# Altium footprint library Package_DFN_QFN.PcbLib: 557 footprints (part 12 of 35)
Each footprint in its own frame and in the unit in brackets; x right, y up, seen from the top. Pads: shape width x height; smd on the part's side, far side on the other; paste and mask are expansions set on the pad; w line width, h text height; cw(c..) or ccw(c..) is an arc to the next point about the centre after c.
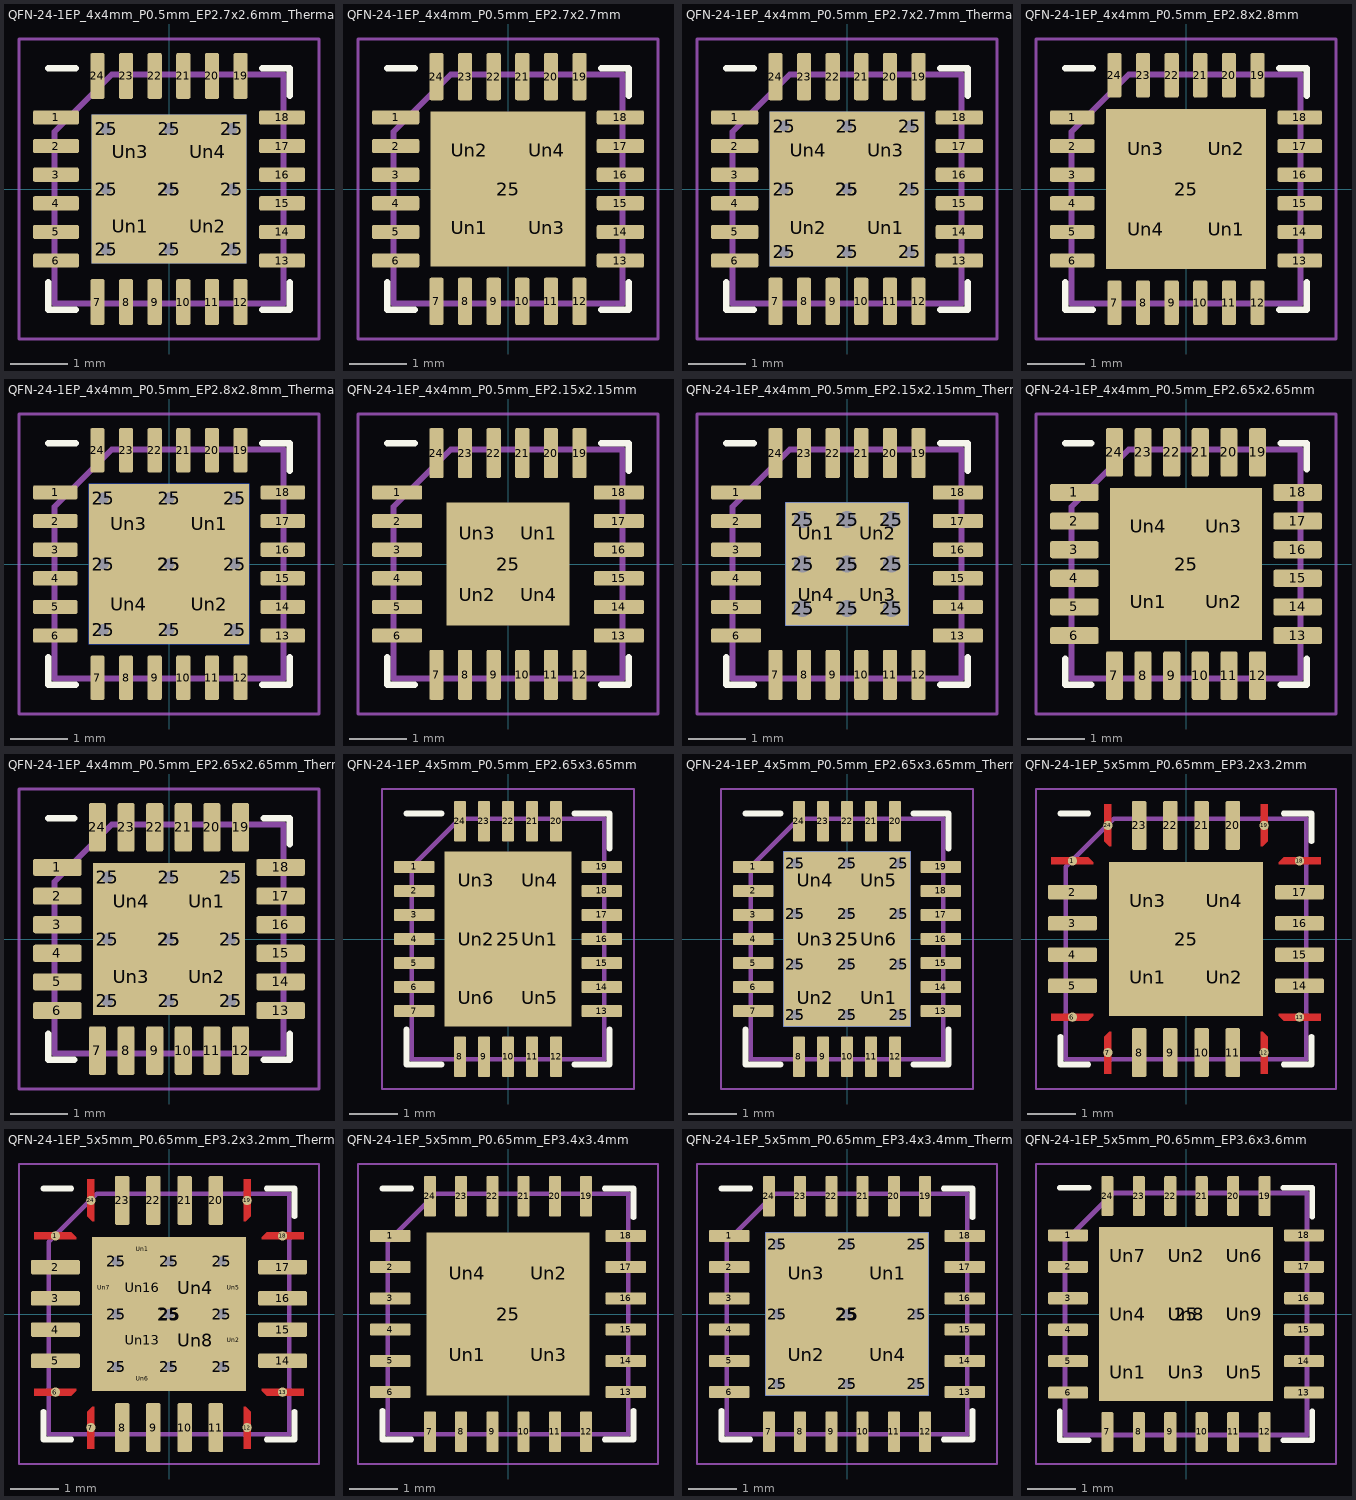
[diagram p11: the footprints below, top view; thin cyan lines are the x and y axes]

## QFN-24-1EP_4x4mm_P0.5mm_EP2.7x2.6mm_ThermalVias [mm]
pads (39):
  rrect25% 0.8x0.25 smd: 1(-1.975,1.25) 2(-1.975,0.75) 3(-1.975,0.25) 4(-1.975,-0.25) 5(-1.975,-0.75) 6(-1.975,-1.25) 13(1.975,-1.25) 14(1.975,-0.75) 15(1.975,-0.25) 16(1.975,0.25) 17(1.975,0.75) 18(1.975,1.25)
  rrect25% 0.25x0.8 smd: 7(-1.25,-1.975) 8(-0.75,-1.975) 9(-0.25,-1.975) 10(0.25,-1.975) 11(0.75,-1.975) 12(1.25,-1.975) 19(1.25,1.975) 20(0.75,1.975) 21(0.25,1.975) 22(-0.25,1.975) 23(-0.75,1.975) 24(-1.25,1.975)
  round 0.5 hole 0.2: 25(-1.1,-1.05) 25(-1.1,0) 25(-1.1,1.05) 25(0,-1.05) 25(0,0) 25(0,1.05) 25(1.1,-1.05) 25(1.1,0) 25(1.1,1.05)
  rect 2.7x2.6 smd: 25(0,0)
  rect 2.7x2.6 smd far side: 25(0,0)
  rrect22% 1.17x1.13 on Top Paste: Un1(-0.675,-0.65) Un2(0.675,-0.65) Un3(-0.675,0.65) Un4(0.675,0.65)
F.SilkS:
  lines w0.12: -2.11,-1.635 -2.11,-2.11 -1.635,-2.11 ; -2.11,2.11 -1.635,2.11 ; 1.635,-2.11 2.11,-2.11 2.11,-1.635 ; 1.635,2.11 2.11,2.11 2.11,1.635
F.CrtYd:
  lines w0.05: -2.62,-2.62 -2.62,2.62 2.62,2.62 2.62,-2.62 -2.62,-2.62
F.Fab:
  lines w0.1: -2,-2 -2,1 -1,2 2,2 2,-2 -2,-2
  text "'.Designator'" at -4.047,-0.84 h1

## QFN-24-1EP_4x4mm_P0.5mm_EP2.7x2.7mm [mm]
pads (29):
  rrect25% 0.825x0.25 smd: 1(-1.963,1.25) 2(-1.963,0.75) 3(-1.963,0.25) 4(-1.963,-0.25) 5(-1.963,-0.75) 6(-1.963,-1.25) 13(1.963,-1.25) 14(1.963,-0.75) 15(1.963,-0.25) 16(1.963,0.25) 17(1.963,0.75) 18(1.963,1.25)
  rrect25% 0.25x0.825 smd: 7(-1.25,-1.963) 8(-0.75,-1.963) 9(-0.25,-1.963) 10(0.25,-1.963) 11(0.75,-1.963) 12(1.25,-1.963) 19(1.25,1.963) 20(0.75,1.963) 21(0.25,1.963) 22(-0.25,1.963) 23(-0.75,1.963) 24(-1.25,1.963)
  rect 2.7x2.7 smd: 25(0,0)
  rrect23% 1.09x1.09 on Top Paste: Un1(-0.675,-0.675) Un2(-0.675,0.675) Un3(0.675,-0.675) Un4(0.675,0.675)
F.SilkS:
  lines w0.12: -2.11,-1.635 -2.11,-2.11 -1.635,-2.11 ; -2.11,2.11 -1.635,2.11 ; 1.635,-2.11 2.11,-2.11 2.11,-1.635 ; 1.635,2.11 2.11,2.11 2.11,1.635
F.CrtYd:
  lines w0.05: -2.62,-2.62 2.62,-2.62 2.62,2.62 -2.62,2.62 -2.62,-2.62
F.Fab:
  lines w0.1: -2,-2 2,-2 2,2 -1,2 -2,1 -2,-2
  text "'.Designator'" at -4.047,-0.84 h1

## QFN-24-1EP_4x4mm_P0.5mm_EP2.7x2.7mm_ThermalVias [mm]
pads (39):
  rrect25% 0.825x0.25 smd: 1(-1.963,1.25) 2(-1.963,0.75) 3(-1.963,0.25) 4(-1.963,-0.25) 5(-1.963,-0.75) 6(-1.963,-1.25) 13(1.963,-1.25) 14(1.963,-0.75) 15(1.963,-0.25) 16(1.963,0.25) 17(1.963,0.75) 18(1.963,1.25)
  rrect25% 0.25x0.825 smd: 7(-1.25,-1.963) 8(-0.75,-1.963) 9(-0.25,-1.963) 10(0.25,-1.963) 11(0.75,-1.963) 12(1.25,-1.963) 19(1.25,1.963) 20(0.75,1.963) 21(0.25,1.963) 22(-0.25,1.963) 23(-0.75,1.963) 24(-1.25,1.963)
  round 0.5 hole 0.2: 25(-1.1,-1.1) 25(-1.1,0) 25(-1.1,1.1) 25(0,-1.1) 25(0,0) 25(0,1.1) 25(1.1,-1.1) 25(1.1,0) 25(1.1,1.1)
  rect 2.7x2.7 smd far side: 25(0,0)
  rect 2.7x2.7 smd: 25(0,0)
  rrect21% 1.17x1.17 on Top Paste: Un1(0.675,-0.675) Un2(-0.675,-0.675) Un3(0.675,0.675) Un4(-0.675,0.675)
F.SilkS:
  lines w0.12: -2.11,-1.635 -2.11,-2.11 -1.635,-2.11 ; -2.11,2.11 -1.635,2.11 ; 1.635,-2.11 2.11,-2.11 2.11,-1.635 ; 1.635,2.11 2.11,2.11 2.11,1.635
F.CrtYd:
  lines w0.05: -2.62,-2.62 2.62,-2.62 2.62,2.62 -2.62,2.62 -2.62,-2.62
F.Fab:
  lines w0.1: -2,-2 -2,1 -1,2 2,2 2,-2 -2,-2
  text "'.Designator'" at -4.047,-0.84 h1

## QFN-24-1EP_4x4mm_P0.5mm_EP2.8x2.8mm [mm]
pads (29):
  rrect25% 0.775x0.25 smd: 1(-1.987,1.25) 2(-1.987,0.75) 3(-1.987,0.25) 4(-1.987,-0.25) 5(-1.987,-0.75) 6(-1.987,-1.25) 13(1.987,-1.25) 14(1.987,-0.75) 15(1.987,-0.25) 16(1.987,0.25) 17(1.987,0.75) 18(1.987,1.25)
  rrect25% 0.25x0.775 smd: 7(-1.25,-1.987) 8(-0.75,-1.987) 9(-0.25,-1.987) 10(0.25,-1.987) 11(0.75,-1.987) 12(1.25,-1.987) 19(1.25,1.987) 20(0.75,1.987) 21(0.25,1.987) 22(-0.25,1.987) 23(-0.75,1.987) 24(-1.25,1.987)
  rect 2.8x2.8 smd: 25(0,0)
  rrect22% 1.13x1.13 on Top Paste: Un1(0.7,-0.7) Un2(0.7,0.7) Un3(-0.7,0.7) Un4(-0.7,-0.7)
F.SilkS:
  lines w0.12: -2.11,-1.635 -2.11,-2.11 -1.635,-2.11 ; -2.11,2.11 -1.635,2.11 ; 1.635,-2.11 2.11,-2.11 2.11,-1.635 ; 1.635,2.11 2.11,2.11 2.11,1.635
F.CrtYd:
  lines w0.05: -2.62,-2.62 -2.62,2.62 2.62,2.62 2.62,-2.62 -2.62,-2.62
F.Fab:
  lines w0.1: -2,-2 2,-2 2,2 -1,2 -2,1 -2,-2
  text "'.Designator'" at -4.047,-0.84 h1

## QFN-24-1EP_4x4mm_P0.5mm_EP2.8x2.8mm_ThermalVias [mm]
pads (39):
  rrect25% 0.775x0.25 smd: 1(-1.987,1.25) 2(-1.987,0.75) 3(-1.987,0.25) 4(-1.987,-0.25) 5(-1.987,-0.75) 6(-1.987,-1.25) 13(1.987,-1.25) 14(1.987,-0.75) 15(1.987,-0.25) 16(1.987,0.25) 17(1.987,0.75) 18(1.987,1.25)
  rrect25% 0.25x0.775 smd: 7(-1.25,-1.987) 8(-0.75,-1.987) 9(-0.25,-1.987) 10(0.25,-1.987) 11(0.75,-1.987) 12(1.25,-1.987) 19(1.25,1.987) 20(0.75,1.987) 21(0.25,1.987) 22(-0.25,1.987) 23(-0.75,1.987) 24(-1.25,1.987)
  round 0.5 hole 0.2: 25(-1.15,-1.15) 25(-1.15,0) 25(-1.15,1.15) 25(0,-1.15) 25(0,0) 25(0,1.15) 25(1.15,-1.15) 25(1.15,0) 25(1.15,1.15)
  rect 2.8x2.8 smd far side: 25(0,0)
  rect 2.8x2.8 smd: 25(0,0)
  rrect21% 1.21x1.21 on Top Paste: Un1(0.7,0.7) Un2(0.7,-0.7) Un3(-0.7,0.7) Un4(-0.7,-0.7)
F.SilkS:
  lines w0.12: -2.11,-1.635 -2.11,-2.11 -1.635,-2.11 ; -2.11,2.11 -1.635,2.11 ; 1.635,-2.11 2.11,-2.11 2.11,-1.635 ; 1.635,2.11 2.11,2.11 2.11,1.635
F.CrtYd:
  lines w0.05: -2.62,-2.62 -2.62,2.62 2.62,2.62 2.62,-2.62 -2.62,-2.62
F.Fab:
  lines w0.1: -2,-2 2,-2 2,2 -1,2 -2,1 -2,-2
  text "'.Designator'" at -4.047,-0.84 h1

## QFN-24-1EP_4x4mm_P0.5mm_EP2.15x2.15mm [mm]
pads (29):
  rrect25% 0.875x0.25 smd: 1(-1.937,1.25) 2(-1.937,0.75) 3(-1.937,0.25) 4(-1.937,-0.25) 5(-1.937,-0.75) 6(-1.937,-1.25) 13(1.937,-1.25) 14(1.937,-0.75) 15(1.937,-0.25) 16(1.937,0.25) 17(1.937,0.75) 18(1.937,1.25)
  rrect25% 0.25x0.875 smd: 7(-1.25,-1.937) 8(-0.75,-1.937) 9(-0.25,-1.937) 10(0.25,-1.937) 11(0.75,-1.937) 12(1.25,-1.937) 19(1.25,1.937) 20(0.75,1.937) 21(0.25,1.937) 22(-0.25,1.937) 23(-0.75,1.937) 24(-1.25,1.937)
  rect 2.15x2.15 smd: 25(0,0)
  rrect25% 0.87x0.87 on Top Paste: Un1(0.54,0.54) Un2(-0.54,-0.54) Un3(-0.54,0.54) Un4(0.54,-0.54)
F.SilkS:
  lines w0.12: -2.11,-1.635 -2.11,-2.11 -1.635,-2.11 ; -2.11,2.11 -1.635,2.11 ; 1.635,-2.11 2.11,-2.11 2.11,-1.635 ; 1.635,2.11 2.11,2.11 2.11,1.635
F.CrtYd:
  lines w0.05: -2.62,-2.62 2.62,-2.62 2.62,2.62 -2.62,2.62 -2.62,-2.62
F.Fab:
  lines w0.1: -2,-2 -2,1 -1,2 2,2 2,-2 -2,-2
  text "'.Designator'" at -4.047,-0.84 h1

## QFN-24-1EP_4x4mm_P0.5mm_EP2.15x2.15mm_ThermalVias [mm]
pads (39):
  rrect25% 0.875x0.25 smd: 1(-1.937,1.25) 2(-1.937,0.75) 3(-1.937,0.25) 4(-1.937,-0.25) 5(-1.937,-0.75) 6(-1.937,-1.25) 13(1.937,-1.25) 14(1.937,-0.75) 15(1.937,-0.25) 16(1.937,0.25) 17(1.937,0.75) 18(1.937,1.25)
  rrect25% 0.25x0.875 smd: 7(-1.25,-1.937) 8(-0.75,-1.937) 9(-0.25,-1.937) 10(0.25,-1.937) 11(0.75,-1.937) 12(1.25,-1.937) 19(1.25,1.937) 20(0.75,1.937) 21(0.25,1.937) 22(-0.25,1.937) 23(-0.75,1.937) 24(-1.25,1.937)
  round 0.6 hole 0.3: 25(-0.775,-0.775) 25(-0.775,0) 25(-0.775,0.775) 25(0,-0.775) 25(0,0) 25(0,0.775) 25(0.775,-0.775) 25(0.775,0) 25(0.775,0.775)
  rect 2.15x2.15 smd far side: 25(0,0)
  rect 2.15x2.15 smd: 25(0,0)
  rrect25% 0.87x0.87 on Top Paste: Un1(-0.54,0.54) Un2(0.54,0.54) Un3(0.54,-0.54) Un4(-0.54,-0.54)
F.SilkS:
  lines w0.12: -2.11,-1.635 -2.11,-2.11 -1.635,-2.11 ; -2.11,2.11 -1.635,2.11 ; 1.635,-2.11 2.11,-2.11 2.11,-1.635 ; 1.635,2.11 2.11,2.11 2.11,1.635
F.CrtYd:
  lines w0.05: -2.62,-2.62 2.62,-2.62 2.62,2.62 -2.62,2.62 -2.62,-2.62
F.Fab:
  lines w0.1: -2,-2 2,-2 2,2 -1,2 -2,1 -2,-2
  text "'.Designator'" at -4.047,-0.84 h1

## QFN-24-1EP_4x4mm_P0.5mm_EP2.65x2.65mm [mm]
pads (29):
  rrect25% 0.85x0.3 smd: 1(-1.95,1.25) 2(-1.95,0.75) 3(-1.95,0.25) 4(-1.95,-0.25) 5(-1.95,-0.75) 6(-1.95,-1.25) 13(1.95,-1.25) 14(1.95,-0.75) 15(1.95,-0.25) 16(1.95,0.25) 17(1.95,0.75) 18(1.95,1.25)
  rrect25% 0.3x0.85 smd: 7(-1.25,-1.95) 8(-0.75,-1.95) 9(-0.25,-1.95) 10(0.25,-1.95) 11(0.75,-1.95) 12(1.25,-1.95) 19(1.25,1.95) 20(0.75,1.95) 21(0.25,1.95) 22(-0.25,1.95) 23(-0.75,1.95) 24(-1.25,1.95)
  rect 2.65x2.65 smd: 25(0,0)
  rrect23% 1.07x1.07 on Top Paste: Un1(-0.66,-0.66) Un2(0.66,-0.66) Un3(0.66,0.66) Un4(-0.66,0.66)
F.SilkS:
  lines w0.12: -2.11,-1.66 -2.11,-2.11 -1.66,-2.11 ; -2.11,2.11 -1.66,2.11 ; 1.66,-2.11 2.11,-2.11 2.11,-1.66 ; 1.66,2.11 2.11,2.11 2.11,1.66
F.CrtYd:
  lines w0.05: -2.62,-2.62 -2.62,2.62 2.62,2.62 2.62,-2.62 -2.62,-2.62
F.Fab:
  lines w0.1: -2,-2 -2,1 -1,2 2,2 2,-2 -2,-2
  text "'.Designator'" at -4.047,-0.84 h1

## QFN-24-1EP_4x4mm_P0.5mm_EP2.65x2.65mm_ThermalVias [mm]
pads (39):
  rrect25% 0.85x0.3 smd: 1(-1.95,1.25) 2(-1.95,0.75) 3(-1.95,0.25) 4(-1.95,-0.25) 5(-1.95,-0.75) 6(-1.95,-1.25) 13(1.95,-1.25) 14(1.95,-0.75) 15(1.95,-0.25) 16(1.95,0.25) 17(1.95,0.75) 18(1.95,1.25)
  rrect25% 0.3x0.85 smd: 7(-1.25,-1.95) 8(-0.75,-1.95) 9(-0.25,-1.95) 10(0.25,-1.95) 11(0.75,-1.95) 12(1.25,-1.95) 19(1.25,1.95) 20(0.75,1.95) 21(0.25,1.95) 22(-0.25,1.95) 23(-0.75,1.95) 24(-1.25,1.95)
  round 0.5 hole 0.2: 25(-1.075,-1.075) 25(-1.075,0) 25(-1.075,1.075) 25(0,-1.075) 25(0,0) 25(0,1.075) 25(1.075,-1.075) 25(1.075,0) 25(1.075,1.075)
  rect 2.65x2.65 smd: 25(0,0)
  rect 2.65x2.65 smd far side: 25(0,0)
  rrect22% 1.15x1.15 on Top Paste: Un1(0.66,0.66) Un2(0.66,-0.66) Un3(-0.66,-0.66) Un4(-0.66,0.66)
F.SilkS:
  lines w0.12: -2.11,-1.66 -2.11,-2.11 -1.66,-2.11 ; -2.11,2.11 -1.66,2.11 ; 1.66,-2.11 2.11,-2.11 2.11,-1.66 ; 1.66,2.11 2.11,2.11 2.11,1.66
F.CrtYd:
  lines w0.05: -2.62,-2.62 -2.62,2.62 2.62,2.62 2.62,-2.62 -2.62,-2.62
F.Fab:
  lines w0.1: -2,-2 -2,1 -1,2 2,2 2,-2 -2,-2
  text "'.Designator'" at -4.047,-0.84 h1

## QFN-24-1EP_4x5mm_P0.5mm_EP2.65x3.65mm [mm]
pads (31):
  rrect25% 0.85x0.25 smd: 1(-1.95,1.5) 2(-1.95,1) 3(-1.95,0.5) 4(-1.95,0) 5(-1.95,-0.5) 6(-1.95,-1) 7(-1.95,-1.5) 13(1.95,-1.5) 14(1.95,-1) 15(1.95,-0.5) 16(1.95,0) 17(1.95,0.5) 18(1.95,1) 19(1.95,1.5)
  rrect25% 0.25x0.85 smd: 8(-1,-2.45) 9(-0.5,-2.45) 10(0,-2.45) 11(0.5,-2.45) 12(1,-2.45) 20(1,2.45) 21(0.5,2.45) 22(0,2.45) 23(-0.5,2.45) 24(-1,2.45)
  rect 2.65x3.65 smd: 25(0,0)
  rrect25% 1.07x0.98 on Top Paste: Un1(0.66,0) Un2(-0.66,0) Un3(-0.66,1.22) Un4(0.66,1.22) Un5(0.66,-1.22) Un6(-0.66,-1.22)
F.SilkS:
  lines w0.12: -2.11,-1.885 -2.11,-2.61 -1.385,-2.61 ; -2.11,2.61 -1.385,2.61 ; 1.385,-2.61 2.11,-2.61 2.11,-1.885 ; 1.385,2.61 2.11,2.61 2.11,1.885
F.CrtYd:
  lines w0.05: -2.62,-3.12 -2.62,3.12 2.62,3.12 2.62,-3.12 -2.62,-3.12
F.Fab:
  lines w0.1: -2,-2.5 -2,1.5 -1,2.5 2,2.5 2,-2.5 -2,-2.5
  text "'.Designator'" at -4.047,-0.84 h1

## QFN-24-1EP_4x5mm_P0.5mm_EP2.65x3.65mm_ThermalVias [mm]
pads (44):
  rrect25% 0.85x0.25 smd: 1(-1.95,1.5) 2(-1.95,1) 3(-1.95,0.5) 4(-1.95,0) 5(-1.95,-0.5) 6(-1.95,-1) 7(-1.95,-1.5) 13(1.95,-1.5) 14(1.95,-1) 15(1.95,-0.5) 16(1.95,0) 17(1.95,0.5) 18(1.95,1) 19(1.95,1.5)
  rrect25% 0.25x0.85 smd: 8(-1,-2.45) 9(-0.5,-2.45) 10(0,-2.45) 11(0.5,-2.45) 12(1,-2.45) 20(1,2.45) 21(0.5,2.45) 22(0,2.45) 23(-0.5,2.45) 24(-1,2.45)
  round 0.5 hole 0.2: 25(-1.075,-1.575) 25(-1.075,-0.525) 25(-1.075,0.525) 25(-1.075,1.575) 25(0,-1.575) 25(0,-0.525) 25(0,0.525) 25(0,1.575) 25(1.075,-1.575) 25(1.075,-0.525) 25(1.075,0.525) 25(1.075,1.575)
  rect 2.65x3.65 smd far side: 25(0,0)
  rect 2.65x3.65 smd: 25(0,0)
  rrect24% 1.15x1.05 on Top Paste: Un1(0.66,-1.22) Un2(-0.66,-1.22) Un3(-0.66,0) Un4(-0.66,1.22) Un5(0.66,1.22) Un6(0.66,0)
F.SilkS:
  lines w0.12: -2.11,-1.885 -2.11,-2.61 -1.385,-2.61 ; -2.11,2.61 -1.385,2.61 ; 1.385,-2.61 2.11,-2.61 2.11,-1.885 ; 1.385,2.61 2.11,2.61 2.11,1.885
F.CrtYd:
  lines w0.05: -2.62,-3.12 -2.62,3.12 2.62,3.12 2.62,-3.12 -2.62,-3.12
F.Fab:
  lines w0.1: -2,-2.5 2,-2.5 2,2.5 -1,2.5 -2,1.5 -2,-2.5
  text "'.Designator'" at -4.047,-0.84 h1

## QFN-24-1EP_5x5mm_P0.65mm_EP3.2x3.2mm [mm]
pads (29):
  round 0.194 smd: 1(-2.362,1.625) 6(-2.362,-1.625) 7(-1.625,-2.362) 12(1.625,-2.362) 13(2.362,-1.625) 18(2.362,1.625) 19(1.625,2.362) 24(-1.625,2.362)
  rrect25% 1.025x0.3 smd: 2(-2.362,0.975) 3(-2.362,0.325) 4(-2.362,-0.325) 5(-2.362,-0.975) 14(2.362,-0.975) 15(2.362,-0.325) 16(2.362,0.325) 17(2.362,0.975)
  rrect25% 0.3x1.025 smd: 8(-0.975,-2.362) 9(-0.325,-2.362) 10(0.325,-2.362) 11(0.975,-2.362) 20(0.975,2.362) 21(0.325,2.362) 22(-0.325,2.362) 23(-0.975,2.362)
  rect 3.2x3.2 smd: 25(0,0)
  rrect19% 1.29x1.29 on Top Paste: Un1(-0.8,-0.8) Un2(0.8,-0.8) Un3(-0.8,0.8) Un4(0.8,0.8)
F.Cu:
  region: -1.925,1.594 -1.925,1.55 -2.8,1.55 -2.8,1.7 -2.031,1.7
  region: -1.925,-1.594 -2.031,-1.7 -2.8,-1.7 -2.8,-1.55 -1.925,-1.55
  region: -1.55,-2.8 -1.7,-2.8 -1.7,-2.031 -1.594,-1.925 -1.55,-1.925
  region: 1.7,-2.031 1.7,-2.8 1.55,-2.8 1.55,-1.925 1.594,-1.925
  region: 2.8,-1.7 2.031,-1.7 1.925,-1.594 1.925,-1.55 2.8,-1.55
  region: 2.8,1.55 1.925,1.55 1.925,1.594 2.031,1.7 2.8,1.7
  region: 1.7,2.031 1.594,1.925 1.55,1.925 1.55,2.8 1.7,2.8
  region: -1.55,1.925 -1.594,1.925 -1.7,2.031 -1.7,2.8 -1.55,2.8
F.SilkS:
  lines w0.12: -2.61,-2.035 -2.61,-2.61 -2.035,-2.61 ; -2.61,2.61 -2.035,2.61 ; 2.035,-2.61 2.61,-2.61 2.61,-2.035 ; 2.035,2.61 2.61,2.61 2.61,2.035
F.Paste:
  region: -1.925,1.594 -1.925,1.55 -2.8,1.55 -2.8,1.7 -2.031,1.7
  region: -1.925,-1.594 -2.031,-1.7 -2.8,-1.7 -2.8,-1.55 -1.925,-1.55
  region: -1.55,-2.8 -1.7,-2.8 -1.7,-2.031 -1.594,-1.925 -1.55,-1.925
  region: 1.7,-2.031 1.7,-2.8 1.55,-2.8 1.55,-1.925 1.594,-1.925
  region: 2.8,-1.7 2.031,-1.7 1.925,-1.594 1.925,-1.55 2.8,-1.55
  region: 2.8,1.55 1.925,1.55 1.925,1.594 2.031,1.7 2.8,1.7
  region: 1.7,2.031 1.594,1.925 1.55,1.925 1.55,2.8 1.7,2.8
  region: -1.55,1.925 -1.594,1.925 -1.7,2.031 -1.7,2.8 -1.55,2.8
F.Mask:
  region: -1.925,1.594 -1.925,1.55 -2.8,1.55 -2.8,1.7 -2.031,1.7
  region: -1.925,-1.594 -2.031,-1.7 -2.8,-1.7 -2.8,-1.55 -1.925,-1.55
  region: -1.55,-2.8 -1.7,-2.8 -1.7,-2.031 -1.594,-1.925 -1.55,-1.925
  region: 1.7,-2.031 1.7,-2.8 1.55,-2.8 1.55,-1.925 1.594,-1.925
  region: 2.8,-1.7 2.031,-1.7 1.925,-1.594 1.925,-1.55 2.8,-1.55
  region: 2.8,1.55 1.925,1.55 1.925,1.594 2.031,1.7 2.8,1.7
  region: 1.7,2.031 1.594,1.925 1.55,1.925 1.55,2.8 1.7,2.8
  region: -1.55,1.925 -1.594,1.925 -1.7,2.031 -1.7,2.8 -1.55,2.8
F.CrtYd:
  lines w0.05: -3.12,-3.12 -3.12,3.12 3.12,3.12 3.12,-3.12 -3.12,-3.12
F.Fab:
  lines w0.1: -2.5,-2.5 2.5,-2.5 2.5,2.5 -1.5,2.5 -2.5,1.5 -2.5,-2.5
  text "'.Designator'" at -4.047,-0.84 h1

## QFN-24-1EP_5x5mm_P0.65mm_EP3.2x3.2mm_ThermalVias [mm]
pads (51):
  round 0.194 smd: 1(-2.362,1.625) 6(-2.362,-1.625) 7(-1.625,-2.362) 12(1.625,-2.362) 13(2.362,-1.625) 18(2.362,1.625) 19(1.625,2.362) 24(-1.625,2.362)
  rrect25% 1.025x0.3 smd: 2(-2.362,0.975) 3(-2.362,0.325) 4(-2.362,-0.325) 5(-2.362,-0.975) 14(2.362,-0.975) 15(2.362,-0.325) 16(2.362,0.325) 17(2.362,0.975)
  rrect25% 0.3x1.025 smd: 8(-0.975,-2.362) 9(-0.325,-2.362) 10(0.325,-2.362) 11(0.975,-2.362) 20(0.975,2.362) 21(0.325,2.362) 22(-0.325,2.362) 23(-0.975,2.362)
  round 0.5 hole 0.2: 25(-1.1,-1.1) 25(-1.1,0) 25(-1.1,1.1) 25(0,-1.1) 25(0,0) 25(0,1.1) 25(1.1,-1.1) 25(1.1,0) 25(1.1,1.1)
  rect 2.7x2.7 smd far side: 25(0,0)
  rect 3.2x3.2 smd: 25(0,0)
  round 0.313 on Top Paste: Un1(-0.55,1.35) Un2(1.35,-0.55) Un5(1.35,0.55) Un6(-0.55,-1.35) Un7(-1.35,0.55) Un11(0.55,1.35) Un12(0.55,-1.35) Un14(-1.35,-0.55)
  round 0.272 on Top Paste: Un3(-1.35,-1.35) Un9(-1.35,1.35) Un10(1.35,-1.35) Un15(1.35,1.35)
  rrect25% 0.887x0.887 on Top Paste: Un4(0.55,0.55) Un8(0.55,-0.55) Un13(-0.55,-0.55) Un16(-0.55,0.55)
F.Cu:
  region: -1.925,1.594 -1.925,1.55 -2.8,1.55 -2.8,1.7 -2.031,1.7
  region: -1.925,-1.594 -2.031,-1.7 -2.8,-1.7 -2.8,-1.55 -1.925,-1.55
  region: -1.55,-2.8 -1.7,-2.8 -1.7,-2.031 -1.594,-1.925 -1.55,-1.925
  region: 1.7,-2.031 1.7,-2.8 1.55,-2.8 1.55,-1.925 1.594,-1.925
  region: 2.8,-1.7 2.031,-1.7 1.925,-1.594 1.925,-1.55 2.8,-1.55
  region: 2.8,1.55 1.925,1.55 1.925,1.594 2.031,1.7 2.8,1.7
  region: 1.7,2.031 1.594,1.925 1.55,1.925 1.55,2.8 1.7,2.8
  region: -1.55,1.925 -1.594,1.925 -1.7,2.031 -1.7,2.8 -1.55,2.8
F.SilkS:
  lines w0.12: -2.61,-2.035 -2.61,-2.61 -2.035,-2.61 ; -2.61,2.61 -2.035,2.61 ; 2.035,-2.61 2.61,-2.61 2.61,-2.035 ; 2.035,2.61 2.61,2.61 2.61,2.035
F.Paste:
  region: -0.197,1.314 -0.272,1.239 -0.828,1.239 -0.903,1.314 -0.903,1.461 -0.197,1.461
  region: 1.461,-0.903 1.314,-0.903 1.239,-0.828 1.239,-0.272 1.314,-0.197 1.461,-0.197
  region: -1.249,-1.376 -1.249,-1.451 -1.451,-1.451 -1.451,-1.249 -1.376,-1.249
  region: 1.461,0.197 1.314,0.197 1.239,0.272 1.239,0.828 1.314,0.903 1.461,0.903
  region: -0.197,-1.314 -0.197,-1.461 -0.903,-1.461 -0.903,-1.314 -0.828,-1.239 -0.272,-1.239
  region: -1.239,0.828 -1.239,0.272 -1.314,0.197 -1.461,0.197 -1.461,0.903 -1.314,0.903
  region: -1.249,1.376 -1.376,1.249 -1.451,1.249 -1.451,1.451 -1.249,1.451
  region: 1.451,-1.451 1.249,-1.451 1.249,-1.376 1.376,-1.249 1.451,-1.249
  region: 0.903,1.314 0.828,1.239 0.272,1.239 0.197,1.314 0.197,1.461 0.903,1.461
  region: 0.903,-1.314 0.903,-1.461 0.197,-1.461 0.197,-1.314 0.272,-1.239 0.828,-1.239
  region: -1.239,-0.272 -1.239,-0.828 -1.314,-0.903 -1.461,-0.903 -1.461,-0.197 -1.314,-0.197
  region: 1.451,1.249 1.376,1.249 1.249,1.376 1.249,1.451 1.451,1.451
  region: -1.925,1.594 -1.925,1.55 -2.8,1.55 -2.8,1.7 -2.031,1.7
  region: -1.925,-1.594 -2.031,-1.7 -2.8,-1.7 -2.8,-1.55 -1.925,-1.55
  region: -1.55,-2.8 -1.7,-2.8 -1.7,-2.031 -1.594,-1.925 -1.55,-1.925
  region: 1.7,-2.031 1.7,-2.8 1.55,-2.8 1.55,-1.925 1.594,-1.925
  region: 2.8,-1.7 2.031,-1.7 1.925,-1.594 1.925,-1.55 2.8,-1.55
  region: 2.8,1.55 1.925,1.55 1.925,1.594 2.031,1.7 2.8,1.7
  region: 1.7,2.031 1.594,1.925 1.55,1.925 1.55,2.8 1.7,2.8
  region: -1.55,1.925 -1.594,1.925 -1.7,2.031 -1.7,2.8 -1.55,2.8
F.Mask:
  region: -1.925,1.594 -1.925,1.55 -2.8,1.55 -2.8,1.7 -2.031,1.7
  region: -1.925,-1.594 -2.031,-1.7 -2.8,-1.7 -2.8,-1.55 -1.925,-1.55
  region: -1.55,-2.8 -1.7,-2.8 -1.7,-2.031 -1.594,-1.925 -1.55,-1.925
  region: 1.7,-2.031 1.7,-2.8 1.55,-2.8 1.55,-1.925 1.594,-1.925
  region: 2.8,-1.7 2.031,-1.7 1.925,-1.594 1.925,-1.55 2.8,-1.55
  region: 2.8,1.55 1.925,1.55 1.925,1.594 2.031,1.7 2.8,1.7
  region: 1.7,2.031 1.594,1.925 1.55,1.925 1.55,2.8 1.7,2.8
  region: -1.55,1.925 -1.594,1.925 -1.7,2.031 -1.7,2.8 -1.55,2.8
F.CrtYd:
  lines w0.05: -3.12,-3.12 3.12,-3.12 3.12,3.12 -3.12,3.12 -3.12,-3.12
F.Fab:
  lines w0.1: -2.5,-2.5 2.5,-2.5 2.5,2.5 -1.5,2.5 -2.5,1.5 -2.5,-2.5
  text "'.Designator'" at -4.047,-0.84 h1

## QFN-24-1EP_5x5mm_P0.65mm_EP3.4x3.4mm [mm]
pads (29):
  rrect25% 0.85x0.25 smd: 1(-2.45,1.625) 2(-2.45,0.975) 3(-2.45,0.325) 4(-2.45,-0.325) 5(-2.45,-0.975) 6(-2.45,-1.625) 13(2.45,-1.625) 14(2.45,-0.975) 15(2.45,-0.325) 16(2.45,0.325) 17(2.45,0.975) 18(2.45,1.625)
  rrect25% 0.25x0.85 smd: 7(-1.625,-2.45) 8(-0.975,-2.45) 9(-0.325,-2.45) 10(0.325,-2.45) 11(0.975,-2.45) 12(1.625,-2.45) 19(1.625,2.45) 20(0.975,2.45) 21(0.325,2.45) 22(-0.325,2.45) 23(-0.975,2.45) 24(-1.625,2.45)
  rect 3.4x3.4 smd: 25(0,0)
  rrect18% 1.37x1.37 on Top Paste: Un1(-0.85,-0.85) Un2(0.85,0.85) Un3(0.85,-0.85) Un4(-0.85,0.85)
F.SilkS:
  lines w0.12: -2.61,-2.01 -2.61,-2.61 -2.01,-2.61 ; -2.61,2.61 -2.01,2.61 ; 2.01,-2.61 2.61,-2.61 2.61,-2.01 ; 2.01,2.61 2.61,2.61 2.61,2.01
F.CrtYd:
  lines w0.05: -3.12,-3.12 3.12,-3.12 3.12,3.12 -3.12,3.12 -3.12,-3.12
F.Fab:
  lines w0.1: -2.5,-2.5 -2.5,1.5 -1.5,2.5 2.5,2.5 2.5,-2.5 -2.5,-2.5
  text "'.Designator'" at -4.047,-0.84 h1

## QFN-24-1EP_5x5mm_P0.65mm_EP3.4x3.4mm_ThermalVias [mm]
pads (39):
  rrect25% 0.85x0.25 smd: 1(-2.45,1.625) 2(-2.45,0.975) 3(-2.45,0.325) 4(-2.45,-0.325) 5(-2.45,-0.975) 6(-2.45,-1.625) 13(2.45,-1.625) 14(2.45,-0.975) 15(2.45,-0.325) 16(2.45,0.325) 17(2.45,0.975) 18(2.45,1.625)
  rrect25% 0.25x0.85 smd: 7(-1.625,-2.45) 8(-0.975,-2.45) 9(-0.325,-2.45) 10(0.325,-2.45) 11(0.975,-2.45) 12(1.625,-2.45) 19(1.625,2.45) 20(0.975,2.45) 21(0.325,2.45) 22(-0.325,2.45) 23(-0.975,2.45) 24(-1.625,2.45)
  round 0.5 hole 0.2: 25(-1.45,-1.45) 25(-1.45,0) 25(-1.45,1.45) 25(0,-1.45) 25(0,0) 25(0,1.45) 25(1.45,-1.45) 25(1.45,0) 25(1.45,1.45)
  rect 3.4x3.4 smd: 25(0,0)
  rect 3.4x3.4 smd far side: 25(0,0)
  rrect17% 1.47x1.47 on Top Paste: Un1(0.85,0.85) Un2(-0.85,-0.85) Un3(-0.85,0.85) Un4(0.85,-0.85)
F.SilkS:
  lines w0.12: -2.61,-2.01 -2.61,-2.61 -2.01,-2.61 ; -2.61,2.61 -2.01,2.61 ; 2.01,-2.61 2.61,-2.61 2.61,-2.01 ; 2.01,2.61 2.61,2.61 2.61,2.01
F.CrtYd:
  lines w0.05: -3.12,-3.12 -3.12,3.12 3.12,3.12 3.12,-3.12 -3.12,-3.12
F.Fab:
  lines w0.1: -2.5,-2.5 -2.5,1.5 -1.5,2.5 2.5,2.5 2.5,-2.5 -2.5,-2.5
  text "'.Designator'" at -4.047,-0.84 h1

## QFN-24-1EP_5x5mm_P0.65mm_EP3.6x3.6mm [mm]
pads (34):
  rrect25% 0.825x0.25 smd: 1(-2.438,1.625) 2(-2.438,0.975) 3(-2.438,0.325) 4(-2.438,-0.325) 5(-2.438,-0.975) 6(-2.438,-1.625) 13(2.438,-1.625) 14(2.438,-0.975) 15(2.438,-0.325) 16(2.438,0.325) 17(2.438,0.975) 18(2.438,1.625)
  rrect25% 0.25x0.825 smd: 7(-1.625,-2.438) 8(-0.975,-2.438) 9(-0.325,-2.438) 10(0.325,-2.438) 11(0.975,-2.438) 12(1.625,-2.438) 19(1.625,2.438) 20(0.975,2.438) 21(0.325,2.438) 22(-0.325,2.438) 23(-0.975,2.438) 24(-1.625,2.438)
  rect 3.6x3.6 smd: 25(0,0)
  rrect25% 0.97x0.97 on Top Paste: Un1(-1.2,-1.2) Un2(0,1.2) Un3(0,-1.2) Un4(-1.2,0) Un5(1.2,-1.2) Un6(1.2,1.2) Un7(-1.2,1.2) Un8(0,0) Un9(1.2,0)
F.SilkS:
  lines w0.12: -2.61,-2.01 -2.61,-2.61 -2.01,-2.61 ; -2.61,2.61 -2.01,2.61 ; 2.01,-2.61 2.61,-2.61 2.61,-2.01 ; 2.01,2.61 2.61,2.61 2.61,2.01
F.CrtYd:
  lines w0.05: -3.1,-3.1 -3.1,3.1 3.1,3.1 3.1,-3.1 -3.1,-3.1
F.Fab:
  lines w0.1: -2.5,-2.5 -2.5,1.5 -1.5,2.5 2.5,2.5 2.5,-2.5 -2.5,-2.5
  text "'.Designator'" at -4.047,-0.84 h1